# Altium schematic symbol library MCU_ST_STM32F4.SchLib: 300 symbols (part 9 of 10)
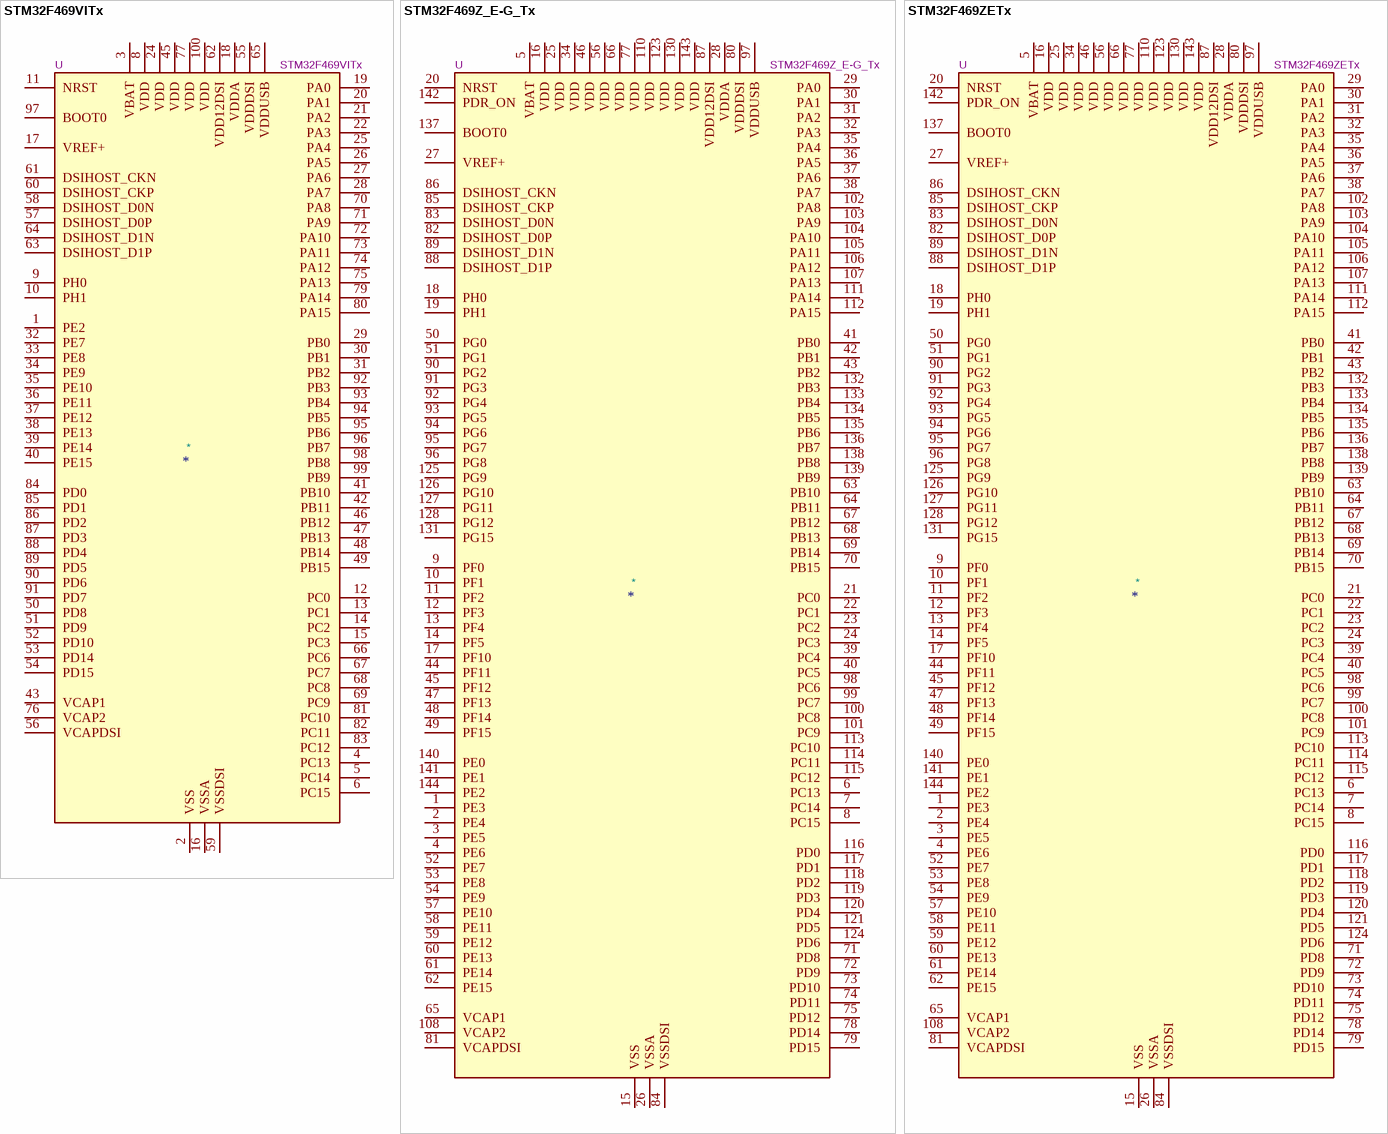
[diagram p84: symbols STM32F469VITx to STM32F469ZETx]

## STM32F469Z_E-G_Tx
designator *  value STM32F469Z_E-G_Tx  Reference: U
ki_keywords: Arm Cortex-M4 STM32F4 STM32F469/479; ki_description: STMicroelectronics Arm Cortex-M4 MCU, 512-1024KB flash, 384KB RAM, 180 MHz, 1.7-3.6V, 106 GPIO, LQFP144; ki_fp_filters: LQFP*20x20mm*P0.5mm*; Footprint: Package_QFP:LQFP-144_20x20mm_P0.5mm; Datasheet: https://www.st.com/resource/en/datasheet/stm32f469ze.pdf
pins: 1 PE3, 2 PE4, 3 PE5, 4 PE6, 5 VBAT, 6 PC13, 7 PC14, 8 PC15, 9 PF0, 10 PF1, 11 PF2, 12 PF3, 13 PF4, 14 PF5, 15 VSS, 16 VDD, 17 PF10, 18 PH0, 19 PH1, 20 NRST, 21 PC0, 22 PC1, 23 PC2, 24 PC3, 25 VDD, 26 VSSA, 27 VREF+, 28 VDDA, 29 PA0, 30 PA1, 31 PA2, 32 PA3, 33 VSS hidden, 34 VDD, 35 PA4, 36 PA5, 37 PA6, 38 PA7, 39 PC4, 40 PC5, 41 PB0, 42 PB1, 43 PB2, 44 PF11, 45 PF12, 46 VDD, 47 PF13, 48 PF14, 49 PF15, 50 PG0, 51 PG1, 52 PE7, 53 PE8, 54 PE9, 55 VSS hidden, 56 VDD, 57 PE10, 58 PE11, 59 PE12, 60 PE13, 61 PE14, 62 PE15, 63 PB10, 64 PB11, 65 VCAP1, 66 VDD, 67 PB12, 68 PB13, 69 PB14, 70 PB15, 71 PD8, 72 PD9, 73 PD10, 74 PD11, 75 PD12, 76 VSS hidden, 77 VDD, 78 PD14, 79 PD15, 80 VDDDSI, 81 VCAPDSI, 82 DSIHOST_D0P, 83 DSIHOST_D0N, 84 VSSDSI, 85 DSIHOST_CKP, 86 DSIHOST_CKN, 87 VDD12DSI, 88 DSIHOST_D1P, 89 DSIHOST_D1N, 90 PG2, 91 PG3, 92 PG4, 93 PG5, 94 PG6, 95 PG7, 96 PG8, 97 VDDUSB, 98 PC6, 99 PC7, 100 PC8, 101 PC9, 102 PA8, 103 PA9, 104 PA10, 105 PA11, 106 PA12, 107 PA13, 108 VCAP2, 109 VSS hidden, 110 VDD, 111 PA14, 112 PA15, 113 PC10, 114 PC11, 115 PC12, 116 PD0, 117 PD1, 118 PD2, 119 PD3, 120 PD4, 121 PD5, 122 VSS hidden, 123 VDD, 124 PD6, 125 PG9, 126 PG10, 127 PG11, 128 PG12, 129 VSS hidden, 130 VDD, 131 PG15, 132 PB3, 133 PB4, 134 PB5, 135 PB6, 136 PB7, 137 BOOT0, 138 PB8, 139 PB9, 140 PE0, 141 PE1, 142 PDR_ON, 143 VDD, 144 PE2

## STM32F469ZETx
designator *  value STM32F469ZETx  Reference: U
ki_keywords: Arm Cortex-M4 STM32F4 STM32F469/479; ki_description: STMicroelectronics Arm Cortex-M4 MCU, 512KB flash, 384KB RAM, 180 MHz, 1.7-3.6V, 106 GPIO, LQFP144; ki_fp_filters: LQFP*20x20mm*P0.5mm*; Footprint: Package_QFP:LQFP-144_20x20mm_P0.5mm; Datasheet: https://www.st.com/resource/en/datasheet/stm32f469ze.pdf
pins: 1 PE3, 2 PE4, 3 PE5, 4 PE6, 5 VBAT, 6 PC13, 7 PC14, 8 PC15, 9 PF0, 10 PF1, 11 PF2, 12 PF3, 13 PF4, 14 PF5, 15 VSS, 16 VDD, 17 PF10, 18 PH0, 19 PH1, 20 NRST, 21 PC0, 22 PC1, 23 PC2, 24 PC3, 25 VDD, 26 VSSA, 27 VREF+, 28 VDDA, 29 PA0, 30 PA1, 31 PA2, 32 PA3, 33 VSS hidden, 34 VDD, 35 PA4, 36 PA5, 37 PA6, 38 PA7, 39 PC4, 40 PC5, 41 PB0, 42 PB1, 43 PB2, 44 PF11, 45 PF12, 46 VDD, 47 PF13, 48 PF14, 49 PF15, 50 PG0, 51 PG1, 52 PE7, 53 PE8, 54 PE9, 55 VSS hidden, 56 VDD, 57 PE10, 58 PE11, 59 PE12, 60 PE13, 61 PE14, 62 PE15, 63 PB10, 64 PB11, 65 VCAP1, 66 VDD, 67 PB12, 68 PB13, 69 PB14, 70 PB15, 71 PD8, 72 PD9, 73 PD10, 74 PD11, 75 PD12, 76 VSS hidden, 77 VDD, 78 PD14, 79 PD15, 80 VDDDSI, 81 VCAPDSI, 82 DSIHOST_D0P, 83 DSIHOST_D0N, 84 VSSDSI, 85 DSIHOST_CKP, 86 DSIHOST_CKN, 87 VDD12DSI, 88 DSIHOST_D1P, 89 DSIHOST_D1N, 90 PG2, 91 PG3, 92 PG4, 93 PG5, 94 PG6, 95 PG7, 96 PG8, 97 VDDUSB, 98 PC6, 99 PC7, 100 PC8, 101 PC9, 102 PA8, 103 PA9, 104 PA10, 105 PA11, 106 PA12, 107 PA13, 108 VCAP2, 109 VSS hidden, 110 VDD, 111 PA14, 112 PA15, 113 PC10, 114 PC11, 115 PC12, 116 PD0, 117 PD1, 118 PD2, 119 PD3, 120 PD4, 121 PD5, 122 VSS hidden, 123 VDD, 124 PD6, 125 PG9, 126 PG10, 127 PG11, 128 PG12, 129 VSS hidden, 130 VDD, 131 PG15, 132 PB3, 133 PB4, 134 PB5, 135 PB6, 136 PB7, 137 BOOT0, 138 PB8, 139 PB9, 140 PE0, 141 PE1, 142 PDR_ON, 143 VDD, 144 PE2

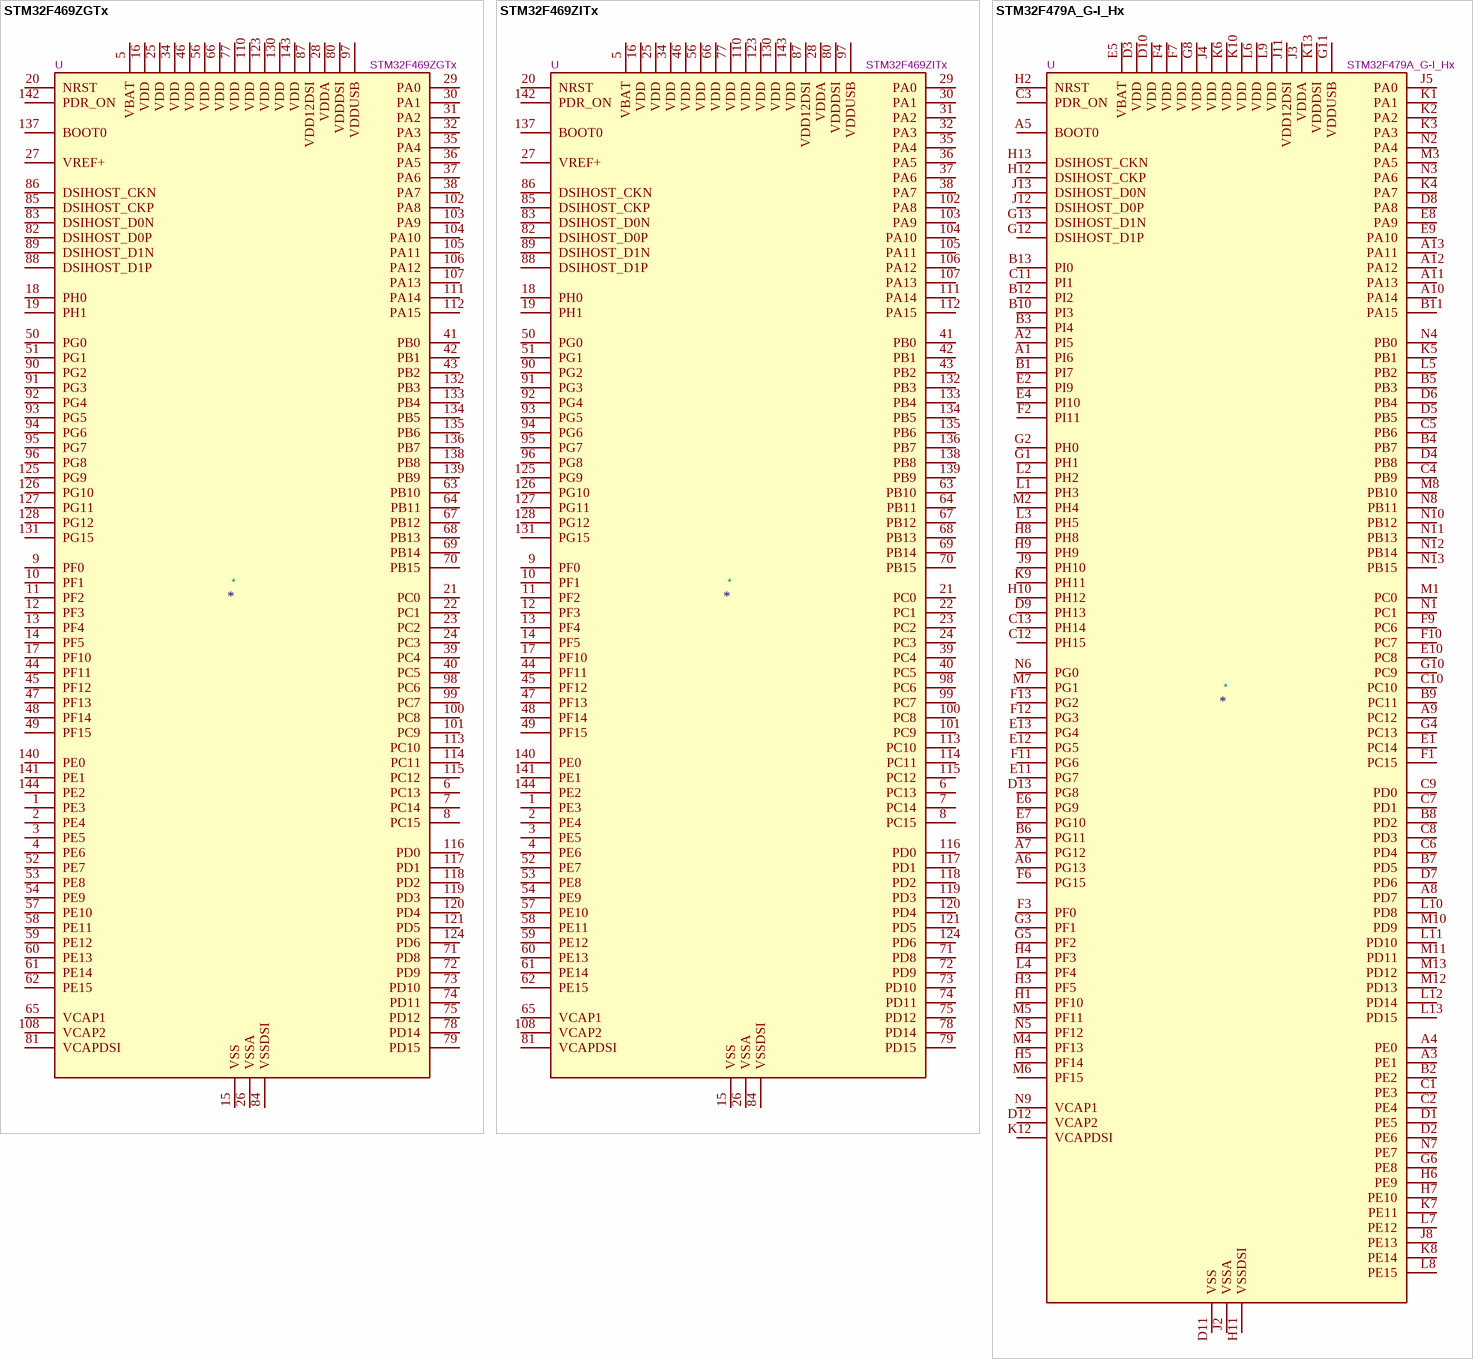
[diagram p68: symbols STM32F469ZGTx to STM32F479A_G-I_Hx]

## STM32F469ZGTx
designator *  value STM32F469ZGTx  Reference: U
ki_keywords: Arm Cortex-M4 STM32F4 STM32F469/479; ki_description: STMicroelectronics Arm Cortex-M4 MCU, 1024KB flash, 384KB RAM, 180 MHz, 1.7-3.6V, 106 GPIO, LQFP144; ki_fp_filters: LQFP*20x20mm*P0.5mm*; Footprint: Package_QFP:LQFP-144_20x20mm_P0.5mm; Datasheet: https://www.st.com/resource/en/datasheet/stm32f469zg.pdf
pins: 1 PE3, 2 PE4, 3 PE5, 4 PE6, 5 VBAT, 6 PC13, 7 PC14, 8 PC15, 9 PF0, 10 PF1, 11 PF2, 12 PF3, 13 PF4, 14 PF5, 15 VSS, 16 VDD, 17 PF10, 18 PH0, 19 PH1, 20 NRST, 21 PC0, 22 PC1, 23 PC2, 24 PC3, 25 VDD, 26 VSSA, 27 VREF+, 28 VDDA, 29 PA0, 30 PA1, 31 PA2, 32 PA3, 33 VSS hidden, 34 VDD, 35 PA4, 36 PA5, 37 PA6, 38 PA7, 39 PC4, 40 PC5, 41 PB0, 42 PB1, 43 PB2, 44 PF11, 45 PF12, 46 VDD, 47 PF13, 48 PF14, 49 PF15, 50 PG0, 51 PG1, 52 PE7, 53 PE8, 54 PE9, 55 VSS hidden, 56 VDD, 57 PE10, 58 PE11, 59 PE12, 60 PE13, 61 PE14, 62 PE15, 63 PB10, 64 PB11, 65 VCAP1, 66 VDD, 67 PB12, 68 PB13, 69 PB14, 70 PB15, 71 PD8, 72 PD9, 73 PD10, 74 PD11, 75 PD12, 76 VSS hidden, 77 VDD, 78 PD14, 79 PD15, 80 VDDDSI, 81 VCAPDSI, 82 DSIHOST_D0P, 83 DSIHOST_D0N, 84 VSSDSI, 85 DSIHOST_CKP, 86 DSIHOST_CKN, 87 VDD12DSI, 88 DSIHOST_D1P, 89 DSIHOST_D1N, 90 PG2, 91 PG3, 92 PG4, 93 PG5, 94 PG6, 95 PG7, 96 PG8, 97 VDDUSB, 98 PC6, 99 PC7, 100 PC8, 101 PC9, 102 PA8, 103 PA9, 104 PA10, 105 PA11, 106 PA12, 107 PA13, 108 VCAP2, 109 VSS hidden, 110 VDD, 111 PA14, 112 PA15, 113 PC10, 114 PC11, 115 PC12, 116 PD0, 117 PD1, 118 PD2, 119 PD3, 120 PD4, 121 PD5, 122 VSS hidden, 123 VDD, 124 PD6, 125 PG9, 126 PG10, 127 PG11, 128 PG12, 129 VSS hidden, 130 VDD, 131 PG15, 132 PB3, 133 PB4, 134 PB5, 135 PB6, 136 PB7, 137 BOOT0, 138 PB8, 139 PB9, 140 PE0, 141 PE1, 142 PDR_ON, 143 VDD, 144 PE2

## STM32F469ZITx
designator *  value STM32F469ZITx  Reference: U
ki_keywords: Arm Cortex-M4 STM32F4 STM32F469/479; ki_description: STMicroelectronics Arm Cortex-M4 MCU, 2048KB flash, 384KB RAM, 180 MHz, 1.7-3.6V, 106 GPIO, LQFP144; ki_fp_filters: LQFP*20x20mm*P0.5mm*; Footprint: Package_QFP:LQFP-144_20x20mm_P0.5mm; Datasheet: https://www.st.com/resource/en/datasheet/stm32f469zi.pdf
pins: 1 PE3, 2 PE4, 3 PE5, 4 PE6, 5 VBAT, 6 PC13, 7 PC14, 8 PC15, 9 PF0, 10 PF1, 11 PF2, 12 PF3, 13 PF4, 14 PF5, 15 VSS, 16 VDD, 17 PF10, 18 PH0, 19 PH1, 20 NRST, 21 PC0, 22 PC1, 23 PC2, 24 PC3, 25 VDD, 26 VSSA, 27 VREF+, 28 VDDA, 29 PA0, 30 PA1, 31 PA2, 32 PA3, 33 VSS hidden, 34 VDD, 35 PA4, 36 PA5, 37 PA6, 38 PA7, 39 PC4, 40 PC5, 41 PB0, 42 PB1, 43 PB2, 44 PF11, 45 PF12, 46 VDD, 47 PF13, 48 PF14, 49 PF15, 50 PG0, 51 PG1, 52 PE7, 53 PE8, 54 PE9, 55 VSS hidden, 56 VDD, 57 PE10, 58 PE11, 59 PE12, 60 PE13, 61 PE14, 62 PE15, 63 PB10, 64 PB11, 65 VCAP1, 66 VDD, 67 PB12, 68 PB13, 69 PB14, 70 PB15, 71 PD8, 72 PD9, 73 PD10, 74 PD11, 75 PD12, 76 VSS hidden, 77 VDD, 78 PD14, 79 PD15, 80 VDDDSI, 81 VCAPDSI, 82 DSIHOST_D0P, 83 DSIHOST_D0N, 84 VSSDSI, 85 DSIHOST_CKP, 86 DSIHOST_CKN, 87 VDD12DSI, 88 DSIHOST_D1P, 89 DSIHOST_D1N, 90 PG2, 91 PG3, 92 PG4, 93 PG5, 94 PG6, 95 PG7, 96 PG8, 97 VDDUSB, 98 PC6, 99 PC7, 100 PC8, 101 PC9, 102 PA8, 103 PA9, 104 PA10, 105 PA11, 106 PA12, 107 PA13, 108 VCAP2, 109 VSS hidden, 110 VDD, 111 PA14, 112 PA15, 113 PC10, 114 PC11, 115 PC12, 116 PD0, 117 PD1, 118 PD2, 119 PD3, 120 PD4, 121 PD5, 122 VSS hidden, 123 VDD, 124 PD6, 125 PG9, 126 PG10, 127 PG11, 128 PG12, 129 VSS hidden, 130 VDD, 131 PG15, 132 PB3, 133 PB4, 134 PB5, 135 PB6, 136 PB7, 137 BOOT0, 138 PB8, 139 PB9, 140 PE0, 141 PE1, 142 PDR_ON, 143 VDD, 144 PE2

## STM32F479A_G-I_Hx
designator *  value STM32F479A_G-I_Hx  Reference: U
ki_keywords: Arm Cortex-M4 STM32F4 STM32F469/479; ki_description: STMicroelectronics Arm Cortex-M4 MCU, 1024-2048KB flash, 384KB RAM, 180 MHz, 1.7-3.6V, 128 GPIO, UFBGA169; ki_fp_filters: *UFBGA*7x7mm*Layout13x13*P0.5mm*; Footprint: Package_BGA:UFBGA-169_7x7mm_Layout13x13_P0.5mm; Datasheet: https://www.st.com/resource/en/datasheet/stm32f479ag.pdf
pins: A1 PI6, A2 PI5, A3 PE1, A4 PE0, A5 BOOT0, A6 PG13, A7 PG12, A8 PD7, A9 PC12, A10 PA14, A11 PA13, A12 PA12, A13 PA11, B1 PI7, B2 PE2, B3 PI4, B4 PB7, B5 PB3, B6 PG11, B7 PD5, B8 PD2, B9 PC11, B10 PI3, B11 PA15, B12 PI2, B13 PI0, C1 PE3, C2 PE4, C3 PDR_ON, C4 PB9, C5 PB6, C6 PD4, C7 PD1, C8 PD3, C9 PD0, C10 PC10, C11 PI1, C12 PH15, C13 PH14, D1 PE5, D2 PE6, D3 VDD, D4 PB8, D5 PB5, D6 PB4, D7 PD6, D8 PA8, D9 PH13, D10 VDD, D11 VSS, D12 VCAP2, D13 PG8, E1 PC14, E2 PI9, E3 VSS hidden, E4 PI10, E5 VBAT, E6 PG9, E7 PG10, E8 PA9, E9 PA10, E10 PC8, E11 PG7, E12 PG5, E13 PG4, F1 PC15, F2 PI11, F3 PF0, F4 VDD, F5 VSS hidden, F6 PG15, F7 VDD, F8 VSS hidden, F9 PC6, F10 PC7, F11 PG6, F12 PG3, F13 PG2, G1 PH1, G2 PH0, G3 PF1, G4 PC13, G5 PF2, G6 PE8, G7 VSS hidden, G8 VDD, G9 VSS hidden, G10 PC9, G11 VDDUSB, G12 DSIHOST_D1P, G13 DSIHOST_D1N, H1 PF10, H2 NRST, H3 PF5, H4 PF3, H5 PF14, H6 PE9, H7 PE10, H8 PH8, H9 PH9, H10 PH12, H11 VSSDSI, H12 DSIHOST_CKP, H13 DSIHOST_CKN, J1 VSS hidden, J2 VSSA, J3 VDDA, J4 VDD, J5 PA0, J6 VSS hidden, J7 VSS hidden, J8 PE13, J9 PH10, J10 VSS hidden, J11 VDD12DSI, J12 DSIHOST_D0P, J13 DSIHOST_D0N, K1 PA1, K2 PA2, K3 PA3, K4 PA7, K5 PB1, K6 VDD, K7 PE11, K8 PE14, K9 PH11, K10 VDD, K11 VSSDSI hidden, K12 VCAPDSI, K13 VDDDSI, L1 PH3, L2 PH2, L3 PH5, L4 PF4, L5 PB2, L6 VDD, L7 PE12, L8 PE15, L9 VDD, L10 PD8, L11 PD10, L12 PD14, L13 PD15, M1 PC0, M2 PH4, M3 PA5, M4 PF13, M5 PF11, M6 PF15, M7 PG1, M8 PB10, M9 VSS hidden, M10 PD9, M11 PD11, M12 PD13, M13 PD12, N1 PC1, N2 PA4, N3 PA6, N4 PB0, N5 PF12, N6 PG0, N7 PE7, N8 PB11, N9 VCAP1, N10 PB12, N11 PB13, N12 PB14, N13 PB15

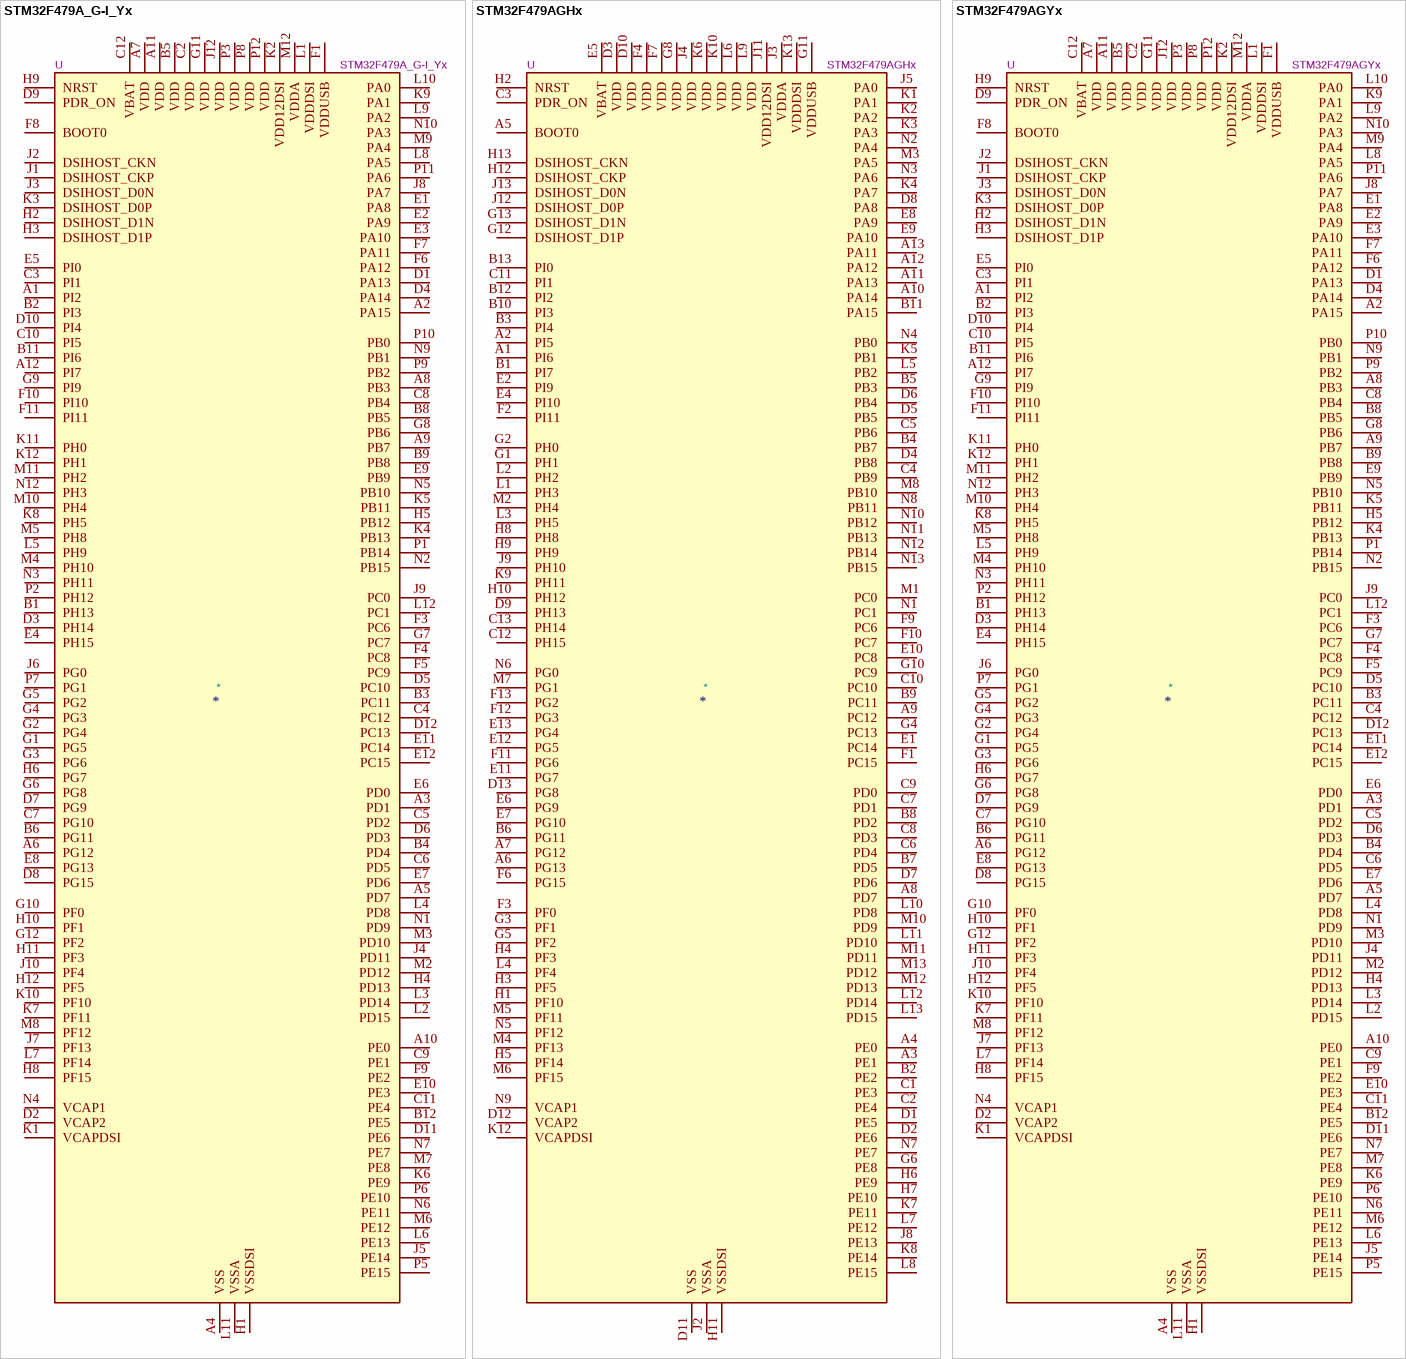
[diagram p69: symbols STM32F479A_G-I_Yx to STM32F479AGYx]

## STM32F479A_G-I_Yx
designator *  value STM32F479A_G-I_Yx  Reference: U
ki_keywords: Arm Cortex-M4 STM32F4 STM32F469/479; ki_description: STMicroelectronics Arm Cortex-M4 MCU, 1024-2048KB flash, 384KB RAM, 180 MHz, 1.7-3.6V, 128 GPIO, WLCSP168; ki_fp_filters: ST*WLCSP*Die434*; Footprint: Package_CSP:ST_WLCSP-168_Die434; Datasheet: https://www.st.com/resource/en/datasheet/stm32f479ag.pdf
pins: A1 PI2, A2 PA15, A3 PD1, A4 VSS, A5 PD7, A6 PG12, A7 VDD, A8 PB3, A9 PB7, A10 PE0, A11 VDD, A12 PI7, B1 PH13, B2 PI3, B3 PC11, B4 PD4, B5 VDD, B6 PG11, B7 VSS hidden, B8 PB5, B9 PB8, B10 VSS hidden, B11 PI6, B12 PE5, C1 VSS hidden, C2 VDD, C3 PI1, C4 PC12, C5 PD2, C6 PD5, C7 PG10, C8 PB4, C9 PE1, C10 PI5, C11 PE4, C12 VBAT, D1 PA13, D2 VCAP2, D3 PH14, D4 PA14, D5 PC10, D6 PD3, D7 PG9, D8 PG15, D9 PDR_ON, D10 PI4, D11 PE6, D12 PC13, E1 PA8, E2 PA9, E3 PA10, E4 PH15, E5 PI0, E6 PD0, E7 PD6, E8 PG13, E9 PB9, E10 PE3, E11 PC14, E12 PC15, F1 VDDUSB, F2 VSS hidden, F3 PC6, F4 PC8, F5 PC9, F6 PA12, F7 PA11, F8 BOOT0, F9 PE2, F10 PI10, F11 PI11, F12 VSS hidden, G1 PG5, G2 PG4, G3 PG6, G4 PG3, G5 PG2, G6 PG8, G7 PC7, G8 PB6, G9 PI9, G10 PF0, G11 VDD, G12 PF2, H1 VSSDSI, H2 DSIHOST_D1N, H3 DSIHOST_D1P, H4 PD13, H5 PB12, H6 PG7, H7 VSS hidden, H8 PF15, H9 NRST, H10 PF1, H11 PF3, H12 PF5, J1 DSIHOST_CKP, J2 DSIHOST_CKN, J3 DSIHOST_D0N, J4 PD11, J5 PE14, J6 PG0, J7 PF13, J8 PA7, J9 PC0, J10 PF4, J11 VSS hidden, J12 VDD, K1 VCAPDSI, K2 VDD12DSI, K3 DSIHOST_D0P, K4 PB13, K5 PB11, K6 PE9, K7 PF11, K8 PH5, K9 PA1, K10 PF10, K11 PH0, K12 PH1, L1 VDDDSI, L2 PD15, L3 PD14, L4 PD8, L5 PH9, L6 PE13, L7 PF14, L8 PA5, L9 PA2, L10 PA0, L11 VSSA, L12 PC1, M1 VSS hidden, M2 PD12, M3 PD10, M4 PH10, M5 PH8, M6 PE12, M7 PE8, M8 PF12, M9 PA4, M10 PH4, M11 PH2, M12 VDDA, N1 PD9, N2 PB15, N3 PH11, N4 VCAP1, N5 PB10, N6 PE11, N7 PE7, N8 VSS hidden, N9 PB1, N10 PA3, N11 VSS hidden, N12 PH3, P1 PB14, P2 PH12, P3 VDD, P4 VSS hidden, P5 PE15, P6 PE10, P7 PG1, P8 VDD, P9 PB2, P10 PB0, P11 PA6, P12 VDD

## STM32F479AGHx
designator *  value STM32F479AGHx  Reference: U
ki_keywords: Arm Cortex-M4 STM32F4 STM32F469/479; ki_description: STMicroelectronics Arm Cortex-M4 MCU, 1024KB flash, 384KB RAM, 180 MHz, 1.7-3.6V, 128 GPIO, UFBGA169; ki_fp_filters: *UFBGA*7x7mm*Layout13x13*P0.5mm*; Footprint: Package_BGA:UFBGA-169_7x7mm_Layout13x13_P0.5mm; Datasheet: https://www.st.com/resource/en/datasheet/stm32f479ag.pdf
pins: A1 PI6, A2 PI5, A3 PE1, A4 PE0, A5 BOOT0, A6 PG13, A7 PG12, A8 PD7, A9 PC12, A10 PA14, A11 PA13, A12 PA12, A13 PA11, B1 PI7, B2 PE2, B3 PI4, B4 PB7, B5 PB3, B6 PG11, B7 PD5, B8 PD2, B9 PC11, B10 PI3, B11 PA15, B12 PI2, B13 PI0, C1 PE3, C2 PE4, C3 PDR_ON, C4 PB9, C5 PB6, C6 PD4, C7 PD1, C8 PD3, C9 PD0, C10 PC10, C11 PI1, C12 PH15, C13 PH14, D1 PE5, D2 PE6, D3 VDD, D4 PB8, D5 PB5, D6 PB4, D7 PD6, D8 PA8, D9 PH13, D10 VDD, D11 VSS, D12 VCAP2, D13 PG8, E1 PC14, E2 PI9, E3 VSS hidden, E4 PI10, E5 VBAT, E6 PG9, E7 PG10, E8 PA9, E9 PA10, E10 PC8, E11 PG7, E12 PG5, E13 PG4, F1 PC15, F2 PI11, F3 PF0, F4 VDD, F5 VSS hidden, F6 PG15, F7 VDD, F8 VSS hidden, F9 PC6, F10 PC7, F11 PG6, F12 PG3, F13 PG2, G1 PH1, G2 PH0, G3 PF1, G4 PC13, G5 PF2, G6 PE8, G7 VSS hidden, G8 VDD, G9 VSS hidden, G10 PC9, G11 VDDUSB, G12 DSIHOST_D1P, G13 DSIHOST_D1N, H1 PF10, H2 NRST, H3 PF5, H4 PF3, H5 PF14, H6 PE9, H7 PE10, H8 PH8, H9 PH9, H10 PH12, H11 VSSDSI, H12 DSIHOST_CKP, H13 DSIHOST_CKN, J1 VSS hidden, J2 VSSA, J3 VDDA, J4 VDD, J5 PA0, J6 VSS hidden, J7 VSS hidden, J8 PE13, J9 PH10, J10 VSS hidden, J11 VDD12DSI, J12 DSIHOST_D0P, J13 DSIHOST_D0N, K1 PA1, K2 PA2, K3 PA3, K4 PA7, K5 PB1, K6 VDD, K7 PE11, K8 PE14, K9 PH11, K10 VDD, K11 VSSDSI hidden, K12 VCAPDSI, K13 VDDDSI, L1 PH3, L2 PH2, L3 PH5, L4 PF4, L5 PB2, L6 VDD, L7 PE12, L8 PE15, L9 VDD, L10 PD8, L11 PD10, L12 PD14, L13 PD15, M1 PC0, M2 PH4, M3 PA5, M4 PF13, M5 PF11, M6 PF15, M7 PG1, M8 PB10, M9 VSS hidden, M10 PD9, M11 PD11, M12 PD13, M13 PD12, N1 PC1, N2 PA4, N3 PA6, N4 PB0, N5 PF12, N6 PG0, N7 PE7, N8 PB11, N9 VCAP1, N10 PB12, N11 PB13, N12 PB14, N13 PB15

## STM32F479AGYx
designator *  value STM32F479AGYx  Reference: U
ki_keywords: Arm Cortex-M4 STM32F4 STM32F469/479; ki_description: STMicroelectronics Arm Cortex-M4 MCU, 1024KB flash, 384KB RAM, 180 MHz, 1.7-3.6V, 128 GPIO, WLCSP168; ki_fp_filters: ST*WLCSP*Die434*; Footprint: Package_CSP:ST_WLCSP-168_Die434; Datasheet: https://www.st.com/resource/en/datasheet/stm32f479ag.pdf
pins: A1 PI2, A2 PA15, A3 PD1, A4 VSS, A5 PD7, A6 PG12, A7 VDD, A8 PB3, A9 PB7, A10 PE0, A11 VDD, A12 PI7, B1 PH13, B2 PI3, B3 PC11, B4 PD4, B5 VDD, B6 PG11, B7 VSS hidden, B8 PB5, B9 PB8, B10 VSS hidden, B11 PI6, B12 PE5, C1 VSS hidden, C2 VDD, C3 PI1, C4 PC12, C5 PD2, C6 PD5, C7 PG10, C8 PB4, C9 PE1, C10 PI5, C11 PE4, C12 VBAT, D1 PA13, D2 VCAP2, D3 PH14, D4 PA14, D5 PC10, D6 PD3, D7 PG9, D8 PG15, D9 PDR_ON, D10 PI4, D11 PE6, D12 PC13, E1 PA8, E2 PA9, E3 PA10, E4 PH15, E5 PI0, E6 PD0, E7 PD6, E8 PG13, E9 PB9, E10 PE3, E11 PC14, E12 PC15, F1 VDDUSB, F2 VSS hidden, F3 PC6, F4 PC8, F5 PC9, F6 PA12, F7 PA11, F8 BOOT0, F9 PE2, F10 PI10, F11 PI11, F12 VSS hidden, G1 PG5, G2 PG4, G3 PG6, G4 PG3, G5 PG2, G6 PG8, G7 PC7, G8 PB6, G9 PI9, G10 PF0, G11 VDD, G12 PF2, H1 VSSDSI, H2 DSIHOST_D1N, H3 DSIHOST_D1P, H4 PD13, H5 PB12, H6 PG7, H7 VSS hidden, H8 PF15, H9 NRST, H10 PF1, H11 PF3, H12 PF5, J1 DSIHOST_CKP, J2 DSIHOST_CKN, J3 DSIHOST_D0N, J4 PD11, J5 PE14, J6 PG0, J7 PF13, J8 PA7, J9 PC0, J10 PF4, J11 VSS hidden, J12 VDD, K1 VCAPDSI, K2 VDD12DSI, K3 DSIHOST_D0P, K4 PB13, K5 PB11, K6 PE9, K7 PF11, K8 PH5, K9 PA1, K10 PF10, K11 PH0, K12 PH1, L1 VDDDSI, L2 PD15, L3 PD14, L4 PD8, L5 PH9, L6 PE13, L7 PF14, L8 PA5, L9 PA2, L10 PA0, L11 VSSA, L12 PC1, M1 VSS hidden, M2 PD12, M3 PD10, M4 PH10, M5 PH8, M6 PE12, M7 PE8, M8 PF12, M9 PA4, M10 PH4, M11 PH2, M12 VDDA, N1 PD9, N2 PB15, N3 PH11, N4 VCAP1, N5 PB10, N6 PE11, N7 PE7, N8 VSS hidden, N9 PB1, N10 PA3, N11 VSS hidden, N12 PH3, P1 PB14, P2 PH12, P3 VDD, P4 VSS hidden, P5 PE15, P6 PE10, P7 PG1, P8 VDD, P9 PB2, P10 PB0, P11 PA6, P12 VDD
